# Altium footprint library Connectors_2,54mm.PcbLib: 400 footprints (part 9 of 26)
Each footprint in its own frame and in the unit in brackets; x right, y up, seen from the top. Pads: shape width x height; smd on the part's side, far side on the other; paste and mask are expansions set on the pad; w line width, h text height; cw(c..) or ccw(c..) is an arc to the next point about the centre after c.
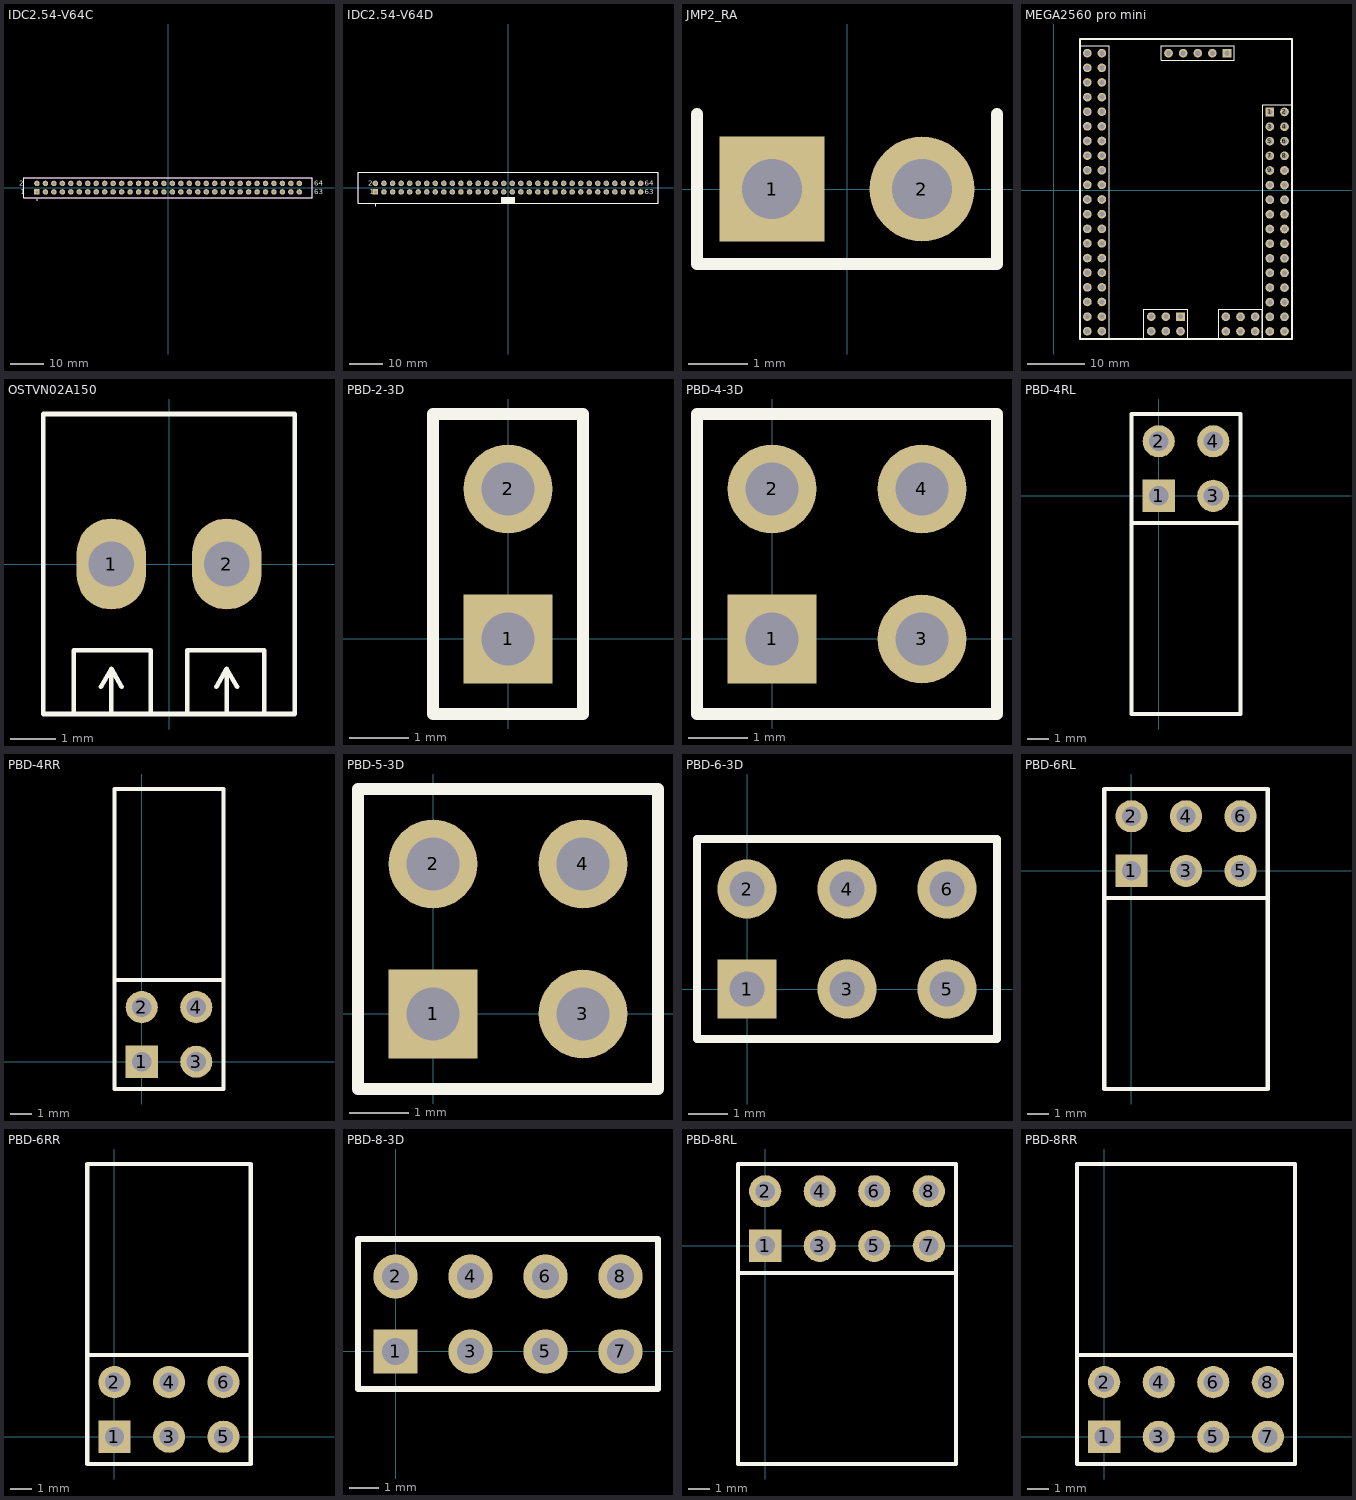
[diagram p8: the footprints below, top view; thin cyan lines are the x and y axes]

## IDC2.54-V64C [mm] "Connector; IDC, PCB Transition - 2 Rows, Thru-Hole; 64 Position; Vertical; Pitch 2.54 mm; Body 86.58 x 6.1 x 7.45 mm (LxWxH), Kinked Contacts"
height 7.45
pads (64):
  rect 1.65x1.65 hole 1: 1(-39.37,-1.27)
  round 1.65 hole 1: 2(-39.37,1.27) 3(-36.83,-1.27) 4(-36.83,1.27) 5(-34.29,-1.27) 6(-34.29,1.27) 7(-31.75,-1.27) 8(-31.75,1.27) 9(-29.21,-1.27) 10(-29.21,1.27) 11(-26.67,-1.27) 12(-26.67,1.27) 13(-24.13,-1.27) 14(-24.13,1.27) 15(-21.59,-1.27) 16(-21.59,1.27) 17(-19.05,-1.27) 18(-19.05,1.27) 19(-16.51,-1.27) 20(-16.51,1.27) 21(-13.97,-1.27) 22(-13.97,1.27) 23(-11.43,-1.27) 24(-11.43,1.27) 25(-8.89,-1.27) 26(-8.89,1.27) 27(-6.35,-1.27) 28(-6.35,1.27) 29(-3.81,-1.27) 30(-3.81,1.27) 31(-1.27,-1.27) 32(-1.27,1.27) 33(1.27,-1.27) 34(1.27,1.27) 35(3.81,-1.27) 36(3.81,1.27) 37(6.35,-1.27) 38(6.35,1.27) 39(8.89,-1.27) 40(8.89,1.27) 41(11.43,-1.27) 42(11.43,1.27) 43(13.97,-1.27) 44(13.97,1.27) 45(16.51,-1.27) 46(16.51,1.27) 47(19.05,-1.27) 48(19.05,1.27) 49(21.59,-1.27) 50(21.59,1.27) 51(24.13,-1.27) 52(24.13,1.27) 53(26.67,-1.27) 54(26.67,1.27) 55(29.21,-1.27) 56(29.21,1.27) 57(31.75,-1.27) 58(31.75,1.27) 59(34.29,-1.27) 60(34.29,1.27) 61(36.83,-1.27) 62(36.83,1.27) 63(39.37,-1.27) 64(39.37,1.27)
Top Overlay:
  circle w0.25: c-39.37,-3.7 r0.125
  lines w0.2: -43.29,-3.05 -43.29,3.05 43.29,3.05 43.29,-3.05 -43.29,-3.05
  text "64" at 43.765,0.52 h1.5
  text "63" at 43.765,-2.02 h1.5
  text "2" at -44.765,0.52 h1.5
  text "1" at -44.265,-2.02 h1.5
Mechanical 13:
  lines w0.1: -43.29,-3.05 -43.29,3.05 43.29,3.05 43.29,-3.05 -43.29,-3.05
3D body: height 7.45, standoff 0, extent -43.29,-3.05 43.29,3.05

## IDC2.54-V64D [mm] "Connector; IDC, Low Profile Male Header, Thru-Hole; 64 Position; Vertical; Pitch 2.54 mm; Body 89.10 x 9.2 x 9.45 mm (LxWxH)"
height 9.45
pads (64):
  rect 1.65x1.65 hole 1: 1(-39.37,-1.27)
  round 1.65 hole 1: 2(-39.37,1.27) 3(-36.83,-1.27) 4(-36.83,1.27) 5(-34.29,-1.27) 6(-34.29,1.27) 7(-31.75,-1.27) 8(-31.75,1.27) 9(-29.21,-1.27) 10(-29.21,1.27) 11(-26.67,-1.27) 12(-26.67,1.27) 13(-24.13,-1.27) 14(-24.13,1.27) 15(-21.59,-1.27) 16(-21.59,1.27) 17(-19.05,-1.27) 18(-19.05,1.27) 19(-16.51,-1.27) 20(-16.51,1.27) 21(-13.97,-1.27) 22(-13.97,1.27) 23(-11.43,-1.27) 24(-11.43,1.27) 25(-8.89,-1.27) 26(-8.89,1.27) 27(-6.35,-1.27) 28(-6.35,1.27) 29(-3.81,-1.27) 30(-3.81,1.27) 31(-1.27,-1.27) 32(-1.27,1.27) 33(1.27,-1.27) 34(1.27,1.27) 35(3.81,-1.27) 36(3.81,1.27) 37(6.35,-1.27) 38(6.35,1.27) 39(8.89,-1.27) 40(8.89,1.27) 41(11.43,-1.27) 42(11.43,1.27) 43(13.97,-1.27) 44(13.97,1.27) 45(16.51,-1.27) 46(16.51,1.27) 47(19.05,-1.27) 48(19.05,1.27) 49(21.59,-1.27) 50(21.59,1.27) 51(24.13,-1.27) 52(24.13,1.27) 53(26.67,-1.27) 54(26.67,1.27) 55(29.21,-1.27) 56(29.21,1.27) 57(31.75,-1.27) 58(31.75,1.27) 59(34.29,-1.27) 60(34.29,1.27) 61(36.83,-1.27) 62(36.83,1.27) 63(39.37,-1.27) 64(39.37,1.27)
Top Overlay:
  circle w0.25: c-39.37,-5.25 r0.125
  rectangle: -2.05,-4.6 2.05,-2.75
  lines w0.2: -44.55,-4.6 44.55,-4.6 44.55,4.6 -44.55,4.6 -44.55,-4.6
  text "63" at 40.57,-2.02 h1.5
  text "64" at 40.57,0.52 h1.5
  text "1" at -41.07,-2.02 h1.5
  text "2" at -41.57,0.52 h1.5
Mechanical 13:
  lines w0.1: -44.55,-4.6 -44.55,4.6 44.55,4.6 44.55,-4.6 -44.55,-4.6
3D body: height 9.45, standoff 0, extent -44.55,-4.6 44.55,4.6

## JMP2_RA [mil] "2-pin RA jumper, 0.1\" .025 pins"
height 98.43
pads (2):
  rect 70x70 hole 40: 1(-50,0)
  round 70 hole 40: 2(50,0)
Top Overlay:
  lines w8: -100,50 -100,-50 100,-50 100,50
3D body "Hdr, 2-pin RA.step": height 98.43, standoff -129.94, extent -100,-12.5 100,393.7

## MEGA2560 pro mini [mm] "Connector; Header; 19x2 Position"
height 8
pads (89):
  rect 1.5x1.5 hole 0.9: 1(37.501,13.629) 39(21.996,-21.891) 89(30.074,23.829)
  round 1.5 hole 0.9: 2(40.041,13.629) 3(37.501,11.089) 4(40.041,11.089) 5(37.501,8.549) 6(40.041,8.549) 7(37.501,6.009) 8(40.041,6.009) 9(37.501,3.469) 10(40.041,3.469) 11(37.501,0.929) 12(40.041,0.929) 13(37.501,-1.611) 14(40.041,-1.611) 15(37.501,-4.151) 16(40.041,-4.151) 17(37.501,-6.691) 18(40.041,-6.691) 19(37.501,-9.231) 20(40.041,-9.231) 21(37.501,-11.771) 22(40.041,-11.771) 23(37.501,-14.311) 24(40.041,-14.311) 25(37.501,-16.851) 26(40.041,-16.851) 27(37.501,-19.391) 28(40.041,-19.391) 29(37.501,-21.931) 30(40.041,-21.931) 31(37.501,-24.471) 32(40.041,-24.471) 33(34.95,-21.92) 34(34.95,-24.46) 35(32.41,-21.92) 36(32.41,-24.46) 37(29.87,-21.92) 38(29.87,-24.46) 40(21.996,-24.431) 41(19.456,-21.891) 42(19.456,-24.431) 43(16.916,-21.891) 44(16.916,-24.431) 45(5.817,-24.431) 46(8.357,-24.431) 47(5.817,-21.891) 48(8.357,-21.891) 49(5.817,-19.351) 50(8.357,-19.351) 51(5.817,-16.811) 52(8.357,-16.811) 53(5.817,-14.271) 54(8.357,-14.271) 55(5.817,-11.731) 56(8.357,-11.731) 57(5.817,-9.191) 58(8.357,-9.191) 59(5.817,-6.651) 60(8.357,-6.651) 61(5.817,-4.111) 62(8.357,-4.111) 63(5.817,-1.571) 64(8.357,-1.571) 65(5.817,0.969) 66(8.357,0.969) 67(5.817,3.509) 68(8.357,3.509) 69(5.817,6.049) 70(8.357,6.049) 71(5.817,8.589) 72(8.357,8.589) 73(5.817,11.129) 74(8.357,11.129) 75(5.817,13.669) 76(8.357,13.669) 77(5.817,16.209) 78(8.357,16.209) 79(5.817,18.749) 80(8.357,18.749) 81(5.817,21.289) 82(8.357,21.289) 83(5.817,23.829) 84(8.357,23.829) 85(19.914,23.829) 86(22.454,23.829) 87(24.994,23.829) 88(27.534,23.829)
Top Overlay:
  lines w0.2: 4.547,26.289 19.914,26.289 ; 15.646,-25.621 15.646,-25.701 ; 15.646,-25.701 15.646,-20.621 23.266,-20.621 23.266,-25.701 15.646,-25.701 ; 4.547,-25.701 4.547,25.099 9.627,25.099 9.627,-25.701 4.547,-25.701 ; 18.644,22.559 31.344,22.559 31.344,25.099 18.644,25.099 18.644,22.559 ; 28.6,-25.73 28.6,-20.65 36.22,-20.65 36.22,-25.73 28.6,-25.73 ; 36.231,-25.741 36.231,14.899 41.311,14.899 41.311,-25.741 36.231,-25.741
  lines w0.4: 4.547,-25.781 4.547,26.289 41.351,26.289 41.351,-25.781 4.547,-25.781
3D body "PBD-2.stp": height 8.5, standoff -3.15, extent 33.68,-25.73 36.22,-20.65
3D body "PBD-2.stp": height 8.5, standoff -3.15, extent 36.231,-25.741 41.311,-23.201
3D body "PBD-2.stp": height 8.5, standoff -3.15, extent 31.14,-25.73 33.68,-20.65
3D body "PBD-2.stp": height 8.5, standoff -3.15, extent 36.231,-20.661 41.311,-18.121
3D body "PBD-2.stp": height 8.5, standoff -3.15, extent 36.231,-18.121 41.311,-15.581
3D body "PBD-2.stp": height 8.5, standoff -3.15, extent 36.231,-23.201 41.311,-20.661
3D body "PBD-2.stp": height 8.5, standoff -3.15, extent 36.231,-13.041 41.311,-10.501
3D body "PBD-2.stp": height 8.5, standoff -3.15, extent 36.231,-10.501 41.311,-7.961
3D body "PBD-2.stp": height 8.5, standoff -3.15, extent 36.231,-15.581 41.311,-13.041
3D body "PBD-2.stp": height 8.5, standoff -3.15, extent 36.231,-5.421 41.311,-2.881
3D body "PBD-2.stp": height 8.5, standoff -3.15, extent 36.231,-2.881 41.311,-0.341
3D body "PBD-2.stp": height 8.5, standoff -3.15, extent 36.231,-7.961 41.311,-5.421
3D body "PBD-2.stp": height 8.5, standoff -3.15, extent 36.231,2.199 41.311,4.739
3D body "PBD-2.stp": height 8.5, standoff -3.15, extent 36.231,4.739 41.311,7.279
3D body "PBD-2.stp": height 8.5, standoff -3.15, extent 36.231,-0.341 41.311,2.199
3D body "PBD-2.stp": height 8.5, standoff -3.15, extent 36.231,9.819 41.311,12.359
3D body "PBD-2.stp": height 8.5, standoff -3.15, extent 36.231,12.359 41.311,14.899
3D body "PBD-2.stp": height 8.5, standoff -3.15, extent 36.231,7.279 41.311,9.819
3D body "PBD-2.stp": height 8.5, standoff -3.15, extent 28.6,-25.73 31.14,-20.65
3D body "PBD-2.stp": height 8.5, standoff -3.15, extent 4.547,17.479 9.627,20.019
3D body "PBD-2.stp": height 8.5, standoff -3.15, extent 4.547,22.559 9.627,25.099
3D body "PBD-2.stp": height 8.5, standoff -3.15, extent 4.547,20.019 9.627,22.559
3D body "PBD-2.stp": height 8.5, standoff -3.15, extent 4.547,9.859 9.627,12.399
3D body "PBD-2.stp": height 8.5, standoff -3.15, extent 4.547,14.939 9.627,17.479
3D body "PBD-2.stp": height 8.5, standoff -3.15, extent 4.547,12.399 9.627,14.939
3D body "PBD-2.stp": height 8.5, standoff -3.15, extent 4.547,2.239 9.627,4.779
3D body "PBD-2.stp": height 8.5, standoff -3.15, extent 4.547,7.319 9.627,9.859
3D body "PBD-2.stp": height 8.5, standoff -3.15, extent 4.547,4.779 9.627,7.319
3D body "PBD-2.stp": height 8.5, standoff -3.15, extent 4.547,-5.381 9.627,-2.841
3D body "PBD-2.stp": height 8.5, standoff -3.15, extent 4.547,-0.301 9.627,2.239
3D body "PBD-2.stp": height 8.5, standoff -3.15, extent 4.547,-2.841 9.627,-0.301
3D body "PBD-2.stp": height 8.5, standoff -3.15, extent 4.547,-13.001 9.627,-10.461
3D body "PBD-2.stp": height 8.5, standoff -3.15, extent 4.547,-7.921 9.627,-5.381
3D body "PBD-2.stp": height 8.5, standoff -3.15, extent 4.547,-10.461 9.627,-7.921
3D body "PBD-2.stp": height 8.5, standoff -3.15, extent 4.547,-20.621 9.627,-18.081
3D body "PBD-2.stp": height 8.5, standoff -3.15, extent 4.547,-15.541 9.627,-13.001
3D body "PBD-2.stp": height 8.5, standoff -3.15, extent 4.547,-18.081 9.627,-15.541
3D body "PBD-2.stp": height 8.5, standoff -3.15, extent 4.547,-23.161 9.627,-20.621
3D body "PBD-2.stp": height 8.5, standoff -3.15, extent 4.547,-25.701 9.627,-23.161
3D body "PBD-2.stp": height 8.5, standoff -3.15, extent 15.646,-25.701 18.186,-20.621
3D body "PBD-2.stp": height 8.5, standoff -3.15, extent 18.186,-25.701 20.726,-20.621
3D body "PBD-2.stp": height 8.5, standoff -3.15, extent 20.726,-25.701 23.266,-20.621
3D body "PBS-1.stp": height 8.5, standoff -3.15, extent 28.804,22.559 31.344,25.099
3D body "PBD-2.stp": height 8.5, standoff -3.15, extent 18.644,22.559 23.724,25.099
3D body "PBD-2.stp": height 8.5, standoff -3.15, extent 23.724,22.559 28.804,25.099

## OSTVN02A150 [mm]
pads (2):
  oval 1.524x2 hole 1: 1(-1.27,0) 2(1.27,0)
Top Overlay:
  lines w0.1: -2.1,-3.3 -2.1,-1.9 -1.27,-1.9 -1.3,-1.9 -0.4,-1.9 -0.4,-3.3 ; -1.04,-2.7 -1.27,-2.3 ; 0.4,-3.3 0.4,-1.9 1.27,-1.9 2.1,-1.9 2.1,-3.3 ; 1.04,-2.7 1.27,-2.3 ; 1.5,-2.7 1.27,-2.3 ; -1.27,-3.3 1.27,-3.3 ; -1.27,-3.3 -2.77,-3.3 -2.77,0 -2.77,3.3 -1.27,3.3 1.27,3.3 2.77,3.3 2.77,0 2.77,-3.3 1.27,-3.3 ; -1.27,-3.3 -1.27,-2.3 ; -1.27,-2.3 -1.5,-2.7 -1.27,-2.3 ; 1.27,-3.3 1.27,-2.3
3D body: height 8.5, standoff 0, extent -2.77,-3.3 2.73,3.3

## PBD-2-3D [mm] "Connector; Header; 2x2 Position"
height 8
pads (2):
  rect 1.5x1.5 hole 0.9: 1(0,0)
  round 1.5 hole 0.9: 2(0,2.54)
Top Overlay:
  lines w0.2: -1.27,-1.27 -1.27,3.81 1.27,3.81 1.27,-1.27 -1.27,-1.27
3D body "PBD-2.stp": height 8.5, standoff -3.15, extent -1.27,-1.27 1.27,3.81

## PBD-4-3D [mm] "Connector; Header; 2x2 Position"
height 8
pads (4):
  rect 1.5x1.5 hole 0.9: 1(0,0)
  round 1.5 hole 0.9: 2(0,2.54) 3(2.54,0) 4(2.54,2.54)
Top Overlay:
  lines w0.2: -1.27,-1.27 -1.27,3.81 3.81,3.81 3.81,-1.27 -1.27,-1.27
3D body "PBD-2.stp": height 8.5, standoff -3.15, extent 1.27,-1.27 3.81,3.81
3D body "PBD-2.stp": height 8.5, standoff -3.15, extent -1.27,-1.27 1.27,3.81

## PBD-4RL [mm] "Connector; Header; 2x2 Position"
height 5
pads (4):
  rect 1.5x1.5 hole 0.9: 1(0,0)
  round 1.5 hole 0.9: 2(0,2.54) 3(2.54,0) 4(2.54,2.54)
Top Overlay:
  lines w0.2: -1.27,-1.27 -1.27,-10.16 3.81,-10.16 3.81,-1.27 ; -1.27,-1.27 3.81,-1.27 ; -1.27,-1.27 -1.27,3.81 3.81,3.81 3.81,-1.27
3D body "PBD-4R.step": height 5, standoff -3, extent -1.27,-10.16 3.81,2.84

## PBD-4RR [mm] "Connector; Header; 2x2 Position"
height 5
pads (4):
  rect 1.5x1.5 hole 0.9: 1(0,0)
  round 1.5 hole 0.9: 2(0,2.54) 3(2.54,0) 4(2.54,2.54)
Top Overlay:
  lines w0.2: -1.27,3.81 -1.27,-1.27 3.81,-1.27 3.81,3.81 ; -1.27,3.81 3.81,3.81 ; -1.27,3.81 -1.27,12.7 3.81,12.7 3.81,3.81
3D body "PBD-4R.step": height 5, standoff -3, extent -1.27,-0.3 3.81,12.7

## PBD-5-3D [mm] "Connector; Header; 2x2 Position"
height 8
pads (4):
  rect 1.5x1.5 hole 0.9: 1(0,0)
  round 1.5 hole 0.9: 2(0,2.54) 3(2.54,0) 4(2.54,2.54)
Top Overlay:
  lines w0.2: -1.27,-1.27 -1.27,3.81 3.81,3.81 3.81,-1.27 -1.27,-1.27
3D body "PBD-2.stp": height 8.5, standoff -3.15, extent 1.27,-1.27 3.81,3.81
3D body "PBD-2.stp": height 8.5, standoff -3.15, extent -1.27,-1.27 1.27,3.81

## PBD-6-3D [mm] "Connector; Header; 3x2 Position"
height 8
pads (6):
  rect 1.5x1.5 hole 0.9: 1(0,0)
  round 1.5 hole 0.9: 2(0,2.54) 3(2.54,0) 4(2.54,2.54) 5(5.08,0) 6(5.08,2.54)
Top Overlay:
  lines w0.2: -1.27,-1.27 6.35,-1.27 6.35,3.81 -1.27,3.81 -1.27,-1.27
3D body "PBD-2.stp": height 8.5, standoff -3.15, extent 1.27,-1.27 3.81,3.81
3D body "PBD-2.stp": height 8.5, standoff -3.15, extent -1.27,-1.27 1.27,3.81
3D body "PBD-2.stp": height 8.5, standoff -3.15, extent 3.81,-1.27 6.35,3.81

## PBD-6RL [mm] "Connector; Header; 3x2 Position"
height 5
pads (6):
  rect 1.5x1.5 hole 0.9: 1(0,0)
  round 1.5 hole 0.9: 2(0,2.54) 3(2.54,0) 4(2.54,2.54) 5(5.08,0) 6(5.08,2.54)
Top Overlay:
  lines w0.2: -1.27,-1.27 -1.27,-10.16 6.35,-10.16 6.35,-1.27 ; -1.27,-1.27 -1.27,3.81 6.35,3.81 6.35,-1.27 ; -1.27,-1.27 6.35,-1.27
3D body "PBD-6R.step": height 5, standoff -3, extent -1.27,-10.16 6.35,2.84

## PBD-6RR [mm] "Connector; Header; 3x2 Position"
height 5
pads (6):
  rect 1.5x1.5 hole 0.9: 1(0,0)
  round 1.5 hole 0.9: 2(0,2.54) 3(2.54,0) 4(2.54,2.54) 5(5.08,0) 6(5.08,2.54)
Top Overlay:
  lines w0.2: -1.27,3.81 -1.27,12.7 6.35,12.7 6.35,3.81 ; -1.27,3.81 -1.27,-1.27 6.35,-1.27 6.35,3.81 ; -1.27,3.81 6.35,3.81
3D body "PBD-6R.step": height 5, standoff -3, extent -1.27,-0.3 6.35,12.7

## PBD-8-3D [mm] "Connector; Header; 4x2 Position"
height 8
pads (8):
  rect 1.5x1.5 hole 0.9: 1(0,0)
  round 1.5 hole 0.9: 2(0,2.54) 3(2.54,0) 4(2.54,2.54) 5(5.08,0) 6(5.08,2.54) 7(7.62,0) 8(7.62,2.54)
Top Overlay:
  lines w0.2: -1.27,-1.27 8.89,-1.27 8.89,3.81 -1.27,3.81 -1.27,-1.27
3D body "PBD-2.stp": height 8.5, standoff -3.15, extent 3.81,-1.27 6.35,3.81
3D body "PBD-2.stp": height 8.5, standoff -3.15, extent 6.35,-1.27 8.89,3.81
3D body "PBD-2.stp": height 8.5, standoff -3.15, extent -1.27,-1.27 1.27,3.81
3D body "PBD-2.stp": height 8.5, standoff -3.15, extent 1.27,-1.27 3.81,3.81

## PBD-8RL [mm] "Connector; Header; 4x2 Position"
height 5
pads (8):
  rect 1.5x1.5 hole 0.9: 1(0,0)
  round 1.5 hole 0.9: 2(0,2.54) 3(2.54,0) 4(2.54,2.54) 5(5.08,0) 6(5.08,2.54) 7(7.62,0) 8(7.62,2.54)
Top Overlay:
  lines w0.2: -1.27,-1.27 8.89,-1.27 ; -1.27,-1.27 -1.27,3.81 8.89,3.81 8.89,-1.27 ; -1.27,-1.27 -1.27,-10.16 8.89,-10.16 8.89,-1.27
3D body "PBD-8R.step": height 5, standoff -3, extent -1.27,-10.16 8.89,2.84

## PBD-8RR [mm] "Connector; Header; 4x2 Position"
height 5
pads (8):
  rect 1.5x1.5 hole 0.9: 1(0,0)
  round 1.5 hole 0.9: 2(0,2.54) 3(2.54,0) 4(2.54,2.54) 5(5.08,0) 6(5.08,2.54) 7(7.62,0) 8(7.62,2.54)
Top Overlay:
  lines w0.2: -1.27,3.81 8.89,3.81 ; -1.27,3.81 -1.27,-1.27 8.89,-1.27 8.89,3.81 ; -1.27,3.81 -1.27,12.7 8.89,12.7 8.89,3.81
3D body "PBD-8R.step": height 5, standoff -3, extent -1.27,-0.3 8.89,12.7